# Altium footprint library ref-packages.PCBLIB: 1543 footprints (part 76 of 103) (continued)
## SQFP-S-10X10-120 [mm] (continued)
  rectangle: 4.95,-1.42 5.9,-1.28
  rectangle: 4.95,-1.12 5.9,-0.98
  rectangle: 4.95,-0.82 5.9,-0.68
  rectangle: 4.95,-0.52 5.9,-0.38
  rectangle: 4.95,-0.22 5.9,-0.08
  rectangle: 4.95,0.08 5.9,0.22
  rectangle: 4.95,0.38 5.9,0.52
  rectangle: 4.95,0.68 5.9,0.82
  rectangle: 4.95,0.98 5.9,1.12
  rectangle: 4.95,1.28 5.9,1.42
  rectangle: 4.95,1.58 5.9,1.72
  rectangle: 4.95,1.88 5.9,2.02
  rectangle: 4.95,2.18 5.9,2.32
  rectangle: 4.95,2.48 5.9,2.62
  rectangle: 4.95,2.78 5.9,2.92
  rectangle: 4.95,3.08 5.9,3.22
  rectangle: 4.95,3.38 5.9,3.52
  rectangle: 4.95,3.68 5.9,3.82
  rectangle: 4.95,3.98 5.9,4.12
  rectangle: 4.95,4.28 5.9,4.42
  rectangle: 4.28,4.95 4.42,5.9
  rectangle: 3.98,4.95 4.12,5.9
  rectangle: 3.68,4.95 3.82,5.9
  rectangle: 3.38,4.95 3.52,5.9
  rectangle: 3.08,4.95 3.22,5.9
  rectangle: 2.78,4.95 2.92,5.9
  rectangle: 2.48,4.95 2.62,5.9
  rectangle: 2.18,4.95 2.32,5.9
  rectangle: 1.88,4.95 2.02,5.9
  rectangle: 1.58,4.95 1.72,5.9
  rectangle: 1.28,4.95 1.42,5.9
  rectangle: 0.98,4.95 1.12,5.9
  rectangle: 0.68,4.95 0.82,5.9
  rectangle: 0.38,4.95 0.52,5.9
  rectangle: 0.08,4.95 0.22,5.9
  rectangle: -0.22,4.95 -0.08,5.9
  rectangle: -0.52,4.95 -0.38,5.9
  rectangle: -0.82,4.95 -0.68,5.9
  rectangle: -1.12,4.95 -0.98,5.9
  rectangle: -1.42,4.95 -1.28,5.9
  rectangle: -1.72,4.95 -1.58,5.9
  rectangle: -2.02,4.95 -1.88,5.9
  rectangle: -2.32,4.95 -2.18,5.9
  rectangle: -2.62,4.95 -2.48,5.9
  rectangle: -2.92,4.95 -2.78,5.9
  rectangle: -3.22,4.95 -3.08,5.9
  rectangle: -3.52,4.95 -3.38,5.9
  rectangle: -3.82,4.95 -3.68,5.9
  rectangle: -4.12,4.95 -3.98,5.9
  rectangle: -4.42,4.95 -4.28,5.9
  rectangle: -5.9,4.28 -4.95,4.42
  rectangle: -5.9,3.98 -4.95,4.12
  rectangle: -5.9,3.68 -4.95,3.82
  rectangle: -5.9,3.38 -4.95,3.52
  rectangle: -5.9,3.08 -4.95,3.22
  rectangle: -5.9,2.78 -4.95,2.92
  rectangle: -5.9,2.48 -4.95,2.62
  rectangle: -5.9,2.18 -4.95,2.32
  rectangle: -5.9,1.88 -4.95,2.02
  rectangle: -5.9,1.58 -4.95,1.72
  rectangle: -5.9,1.28 -4.95,1.42
  rectangle: -5.9,0.98 -4.95,1.12
  rectangle: -5.9,0.68 -4.95,0.82
  rectangle: -5.9,0.38 -4.95,0.52
  rectangle: -5.9,0.08 -4.95,0.22
  rectangle: -5.9,-0.22 -4.95,-0.08
  rectangle: -5.9,-0.52 -4.95,-0.38
  rectangle: -5.9,-0.82 -4.95,-0.68
  rectangle: -5.9,-1.12 -4.95,-0.98
  rectangle: -5.9,-1.42 -4.95,-1.28
  rectangle: -5.9,-1.72 -4.95,-1.58
  rectangle: -5.9,-2.02 -4.95,-1.88
  rectangle: -5.9,-2.32 -4.95,-2.18
  rectangle: -5.9,-2.62 -4.95,-2.48
  rectangle: -5.9,-2.92 -4.95,-2.78
  rectangle: -5.9,-3.22 -4.95,-3.08
  rectangle: -5.9,-3.52 -4.95,-3.38
  rectangle: -5.9,-3.82 -4.95,-3.68
  rectangle: -5.9,-4.12 -4.95,-3.98
  rectangle: -5.9,-4.42 -4.95,-4.28
  lines w0.203: -4.91,-4.91 4.91,-4.91 4.91,4.91 -4.91,4.91 -4.91,-4.91
Mechanical 27:
  lines w0.2: -6.9,-6.9 -6.9,6.9 6.9,6.9 6.9,-6.9 -6.9,-6.9

## SQFP-S-12X12-48 [mm]
pads (48):
  rect 0.5x1.8 smd: 1(-4.4,-7.1) 2(-3.6,-7.1) 3(-2.8,-7.1) 4(-2,-7.1) 5(-1.2,-7.1) 6(-0.4,-7.1) 7(0.4,-7.1) 8(1.2,-7.1) 9(2,-7.1) 10(2.8,-7.1) 11(3.6,-7.1) 12(4.4,-7.1) 25(4.4,7.1) 26(3.6,7.1) 27(2.8,7.1) 28(2,7.1) 29(1.2,7.1) 30(0.4,7.1) 31(-0.4,7.1) 32(-1.2,7.1) 33(-2,7.1) 34(-2.8,7.1) 35(-3.6,7.1) 36(-4.4,7.1)
  rect 1.8x0.5 smd: 13(7.1,-4.4) 14(7.1,-3.6) 15(7.1,-2.8) 16(7.1,-2) 17(7.1,-1.2) 18(7.1,-0.4) 19(7.1,0.4) 20(7.1,1.2) 21(7.1,2) 22(7.1,2.8) 23(7.1,3.6) 24(7.1,4.4) 37(-7.1,4.4) 38(-7.1,3.6) 39(-7.1,2.8) 40(-7.1,2) 41(-7.1,1.2) 42(-7.1,0.4) 43(-7.1,-0.4) 44(-7.1,-1.2) 45(-7.1,-2) 46(-7.1,-2.8) 47(-7.1,-3.6) 48(-7.1,-4.4)
Top Overlay:
  circle w0.254: c-4.5,-4.5 r0.75
  lines w0.203: -5.82,-5.81 5.81,-5.81 5.81,5.81 -5.82,5.81 -5.82,-5.81
Mechanical 16:
  rectangle: -4.62,-7.82 -4.18,-6.05
  rectangle: -3.82,-7.82 -3.38,-6.05
  rectangle: -3.02,-7.82 -2.58,-6.05
  rectangle: -2.22,-7.82 -1.78,-6.05
  rectangle: -1.42,-7.82 -0.98,-6.05
  rectangle: -0.62,-7.82 -0.18,-6.05
  rectangle: 0.18,-7.82 0.62,-6.05
  rectangle: 0.98,-7.82 1.42,-6.05
  rectangle: 1.78,-7.82 2.22,-6.05
  rectangle: 2.58,-7.82 3.02,-6.05
  rectangle: 3.38,-7.82 3.82,-6.05
  rectangle: 4.18,-7.82 4.62,-6.05
  rectangle: 6.05,-4.62 7.82,-4.18
  rectangle: 6.05,-3.82 7.82,-3.38
  rectangle: 6.05,-3.02 7.82,-2.58
  rectangle: 6.05,-2.22 7.82,-1.78
  rectangle: 6.05,-1.42 7.82,-0.98
  rectangle: 6.05,-0.62 7.82,-0.18
  rectangle: 6.05,0.18 7.82,0.62
  rectangle: 6.05,0.98 7.82,1.42
  rectangle: 6.05,1.78 7.82,2.22
  rectangle: 6.05,2.58 7.82,3.02
  rectangle: 6.05,3.38 7.82,3.82
  rectangle: 6.05,4.18 7.82,4.62
  rectangle: 4.18,6.05 4.62,7.82
  rectangle: 3.38,6.05 3.82,7.82
  rectangle: 2.58,6.05 3.02,7.82
  rectangle: 1.78,6.05 2.22,7.82
  rectangle: 0.98,6.05 1.42,7.82
  rectangle: 0.18,6.05 0.62,7.82
  rectangle: -0.62,6.05 -0.18,7.82
  rectangle: -1.42,6.05 -0.98,7.82
  rectangle: -2.22,6.05 -1.78,7.82
  rectangle: -3.02,6.05 -2.58,7.82
  rectangle: -3.82,6.05 -3.38,7.82
  rectangle: -4.62,6.05 -4.18,7.82
  rectangle: -7.82,4.18 -6.05,4.62
  rectangle: -7.82,3.38 -6.05,3.82
  rectangle: -7.82,2.58 -6.05,3.02
  rectangle: -7.82,1.78 -6.05,2.22
  rectangle: -7.82,0.98 -6.05,1.42
  rectangle: -7.82,0.18 -6.05,0.62
  rectangle: -7.82,-0.62 -6.05,-0.18
  rectangle: -7.82,-1.42 -6.05,-0.98
  rectangle: -7.82,-2.22 -6.05,-1.78
  rectangle: -7.82,-3.02 -6.05,-2.58
  rectangle: -7.82,-3.82 -6.05,-3.38
  rectangle: -7.82,-4.62 -6.05,-4.18
  lines w0.203: -6.01,-6.01 6.01,-6.01 6.01,6.01 -6.01,6.01 -6.01,-6.01
Mechanical 27:
  lines w0.2: -8.4,-8.4 -8.4,8.4 8.4,8.4 8.4,-8.4 -8.4,-8.4

## SQFP-S-12X12-64 [mil]
pads (64):
  rect 15.75x70.87 smd: 1(-191.93,-279.53) 2(-166.34,-279.53) 3(-140.75,-279.53) 4(-115.16,-279.53) 5(-89.57,-279.53) 6(-63.98,-279.53) 7(-38.39,-279.53) 8(-12.8,-279.53) 9(12.8,-279.53) 10(38.39,-279.53) 11(63.98,-279.53) 12(89.57,-279.53) 13(115.16,-279.53) 14(140.75,-279.53) 15(166.34,-279.53) 16(191.93,-279.53) 33(191.93,279.53) 34(166.34,279.53) 35(140.75,279.53) 36(115.16,279.53) 37(89.57,279.53) 38(63.98,279.53) 39(38.39,279.53) 40(12.8,279.53) 41(-12.8,279.53) 42(-38.39,279.53) 43(-63.98,279.53) 44(-89.57,279.53) 45(-115.16,279.53) 46(-140.75,279.53) 47(-166.34,279.53) 48(-191.93,279.53)
  rect 70.87x15.75 smd: 17(279.53,-191.93) 18(279.53,-166.34) 19(279.53,-140.75) 20(279.53,-115.16) 21(279.53,-89.57) 22(279.53,-63.98) 23(279.53,-38.39) 24(279.53,-12.8) 25(279.53,12.8) 26(279.53,38.39) 27(279.53,63.98) 28(279.53,89.57) 29(279.53,115.16) 30(279.53,140.75) 31(279.53,166.34) 32(279.53,191.93) 49(-279.53,191.93) 50(-279.53,166.34) 51(-279.53,140.75) 52(-279.53,115.16) 53(-279.53,89.57) 54(-279.53,63.98) 55(-279.53,38.39) 56(-279.53,12.8) 57(-279.53,-12.8) 58(-279.53,-38.39) 59(-279.53,-63.98) 60(-279.53,-89.57) 61(-279.53,-115.16) 62(-279.53,-140.75) 63(-279.53,-166.34) 64(-279.53,-191.93)
Top Overlay:
  circle w10: c-187.01,-187.01 r29.53
  lines w8: -229.13,-228.74 228.74,-228.74 228.74,228.74 -229.13,228.74 -229.13,-228.74
Mechanical 16:
  rectangle: -199.41,-307.87 -184.45,-238.19
  rectangle: -173.82,-307.87 -158.86,-238.19
  rectangle: -148.23,-307.87 -133.27,-238.19
  rectangle: -122.64,-307.87 -107.68,-238.19
  rectangle: -97.05,-307.87 -82.09,-238.19
  rectangle: -71.46,-307.87 -56.5,-238.19
  rectangle: -45.87,-307.87 -30.91,-238.19
  rectangle: -20.28,-307.87 -5.31,-238.19
  rectangle: 5.31,-307.87 20.28,-238.19
  rectangle: 30.91,-307.87 45.87,-238.19
  rectangle: 56.5,-307.87 71.46,-238.19
  rectangle: 82.09,-307.87 97.05,-238.19
  rectangle: 107.68,-307.87 122.64,-238.19
  rectangle: 133.27,-307.87 148.23,-238.19
  rectangle: 158.86,-307.87 173.82,-238.19
  rectangle: 184.45,-307.87 199.41,-238.19
  rectangle: 238.19,-199.41 307.87,-184.45
  rectangle: 238.19,-173.82 307.87,-158.86
  rectangle: 238.19,-148.23 307.87,-133.27
  rectangle: 238.19,-122.64 307.87,-107.68
  rectangle: 238.19,-97.05 307.87,-82.09
  rectangle: 238.19,-71.46 307.87,-56.5
  rectangle: 238.19,-45.87 307.87,-30.91
  rectangle: 238.19,-20.28 307.87,-5.31
  rectangle: 238.19,5.31 307.87,20.28
  rectangle: 238.19,30.91 307.87,45.87
  rectangle: 238.19,56.5 307.87,71.46
  rectangle: 238.19,82.09 307.87,97.05
  rectangle: 238.19,107.68 307.87,122.64
  rectangle: 238.19,133.27 307.87,148.23
  rectangle: 238.19,158.86 307.87,173.82
  rectangle: 238.19,184.45 307.87,199.41
  rectangle: 184.45,238.19 199.41,307.87
  rectangle: 158.86,238.19 173.82,307.87
  rectangle: 133.27,238.19 148.23,307.87
  rectangle: 107.68,238.19 122.64,307.87
  rectangle: 82.09,238.19 97.05,307.87
  rectangle: 56.5,238.19 71.46,307.87
  rectangle: 30.91,238.19 45.87,307.87
  rectangle: 5.31,238.19 20.28,307.87
  rectangle: -20.28,238.19 -5.31,307.87
  rectangle: -45.87,238.19 -30.91,307.87
  rectangle: -71.46,238.19 -56.5,307.87
  rectangle: -97.05,238.19 -82.09,307.87
  rectangle: -122.64,238.19 -107.68,307.87
  rectangle: -148.23,238.19 -133.27,307.87
  rectangle: -173.82,238.19 -158.86,307.87
  rectangle: -199.41,238.19 -184.45,307.87
  rectangle: -307.87,184.45 -238.19,199.41
  rectangle: -307.87,158.86 -238.19,173.82
  rectangle: -307.87,133.27 -238.19,148.23
  rectangle: -307.87,107.68 -238.19,122.64
  rectangle: -307.87,82.09 -238.19,97.05
  rectangle: -307.87,56.5 -238.19,71.46
  rectangle: -307.87,30.91 -238.19,45.87
  rectangle: -307.87,5.31 -238.19,20.28
  rectangle: -307.87,-20.28 -238.19,-5.31
  rectangle: -307.87,-45.87 -238.19,-30.91
  rectangle: -307.87,-71.46 -238.19,-56.5
  rectangle: -307.87,-97.05 -238.19,-82.09
  rectangle: -307.87,-122.64 -238.19,-107.68
  rectangle: -307.87,-148.23 -238.19,-133.27
  rectangle: -307.87,-173.82 -238.19,-158.86
  rectangle: -307.87,-199.41 -238.19,-184.45
  lines w8: -236.61,-236.61 236.61,-236.61 236.61,236.61 -236.61,236.61 -236.61,-236.61
Mechanical 27:
  lines w7.87: -330.71,-330.71 -330.71,330.71 330.71,330.71 330.71,-330.71 -330.71,-330.71

## SQFP-S-12X12-80 [mil]
pads (80):
  rect 11.81x62.99 smd: 1(-187.01,-259.84) 2(-167.32,-259.84) 3(-147.64,-259.84) 4(-127.95,-259.84) 5(-108.27,-259.84) 6(-88.58,-259.84) 7(-68.9,-259.84) 8(-49.21,-259.84) 9(-29.53,-259.84) 10(-9.84,-259.84) 11(9.84,-259.84) 12(29.53,-259.84) 13(49.21,-259.84) 14(68.9,-259.84) 15(88.58,-259.84) 16(108.27,-259.84) 17(127.95,-259.84) 18(147.64,-259.84) 19(167.32,-259.84) 20(187.01,-259.84) 41(187.01,259.84) 42(167.32,259.84) 43(147.64,259.84) 44(127.95,259.84) 45(108.27,259.84) 46(88.58,259.84) 47(68.9,259.84) 48(49.21,259.84) 49(29.53,259.84) 50(9.84,259.84) 51(-9.84,259.84) 52(-29.53,259.84) 53(-49.21,259.84) 54(-68.9,259.84) 55(-88.58,259.84) 56(-108.27,259.84) 57(-127.95,259.84) 58(-147.64,259.84) 59(-167.32,259.84) 60(-187.01,259.84)
  rect 62.99x11.81 smd: 21(259.84,-187.01) 22(259.84,-167.32) 23(259.84,-147.64) 24(259.84,-127.95) 25(259.84,-108.27) 26(259.84,-88.58) 27(259.84,-68.9) 28(259.84,-49.21) 29(259.84,-29.53) 30(259.84,-9.84) 31(259.84,9.84) 32(259.84,29.53) 33(259.84,49.21) 34(259.84,68.9) 35(259.84,88.58) 36(259.84,108.27) 37(259.84,127.95) 38(259.84,147.64) 39(259.84,167.32) 40(259.84,187.01) 61(-259.84,187.01) 62(-259.84,167.32) 63(-259.84,147.64) 64(-259.84,127.95) 65(-259.84,108.27) 66(-259.84,88.58) 67(-259.84,68.9) 68(-259.84,49.21) 69(-259.84,29.53) 70(-259.84,9.84) 71(-259.84,-9.84) 72(-259.84,-29.53) 73(-259.84,-49.21) 74(-259.84,-68.9) 75(-259.84,-88.58) 76(-259.84,-108.27) 77(-259.84,-127.95) 78(-259.84,-147.64) 79(-259.84,-167.32) 80(-259.84,-187.01)
Top Overlay:
  circle w10: c-177.17,-177.17 r29.53
  lines w8: -225.2,-224.8 224.8,-224.8 224.8,224.8 -225.2,224.8 -225.2,-224.8
Mechanical 16:
  rectangle: -192.91,-271.65 -181.1,-234.25
  rectangle: -173.23,-271.65 -161.42,-234.25
  rectangle: -153.54,-271.65 -141.73,-234.25
  rectangle: -133.86,-271.65 -122.05,-234.25
  rectangle: -114.17,-271.65 -102.36,-234.25
  rectangle: -94.49,-271.65 -82.68,-234.25
  rectangle: -74.8,-271.65 -62.99,-234.25
  rectangle: -55.12,-271.65 -43.31,-234.25
  rectangle: -35.43,-271.65 -23.62,-234.25
  rectangle: -15.75,-271.65 -3.94,-234.25
  rectangle: 3.94,-271.65 15.75,-234.25
  rectangle: 23.62,-271.65 35.43,-234.25
  rectangle: 43.31,-271.65 55.12,-234.25
  rectangle: 62.99,-271.65 74.8,-234.25
  rectangle: 82.68,-271.65 94.49,-234.25
  rectangle: 102.36,-271.65 114.17,-234.25
  rectangle: 122.05,-271.65 133.86,-234.25
  rectangle: 141.73,-271.65 153.54,-234.25
  rectangle: 161.42,-271.65 173.23,-234.25
  rectangle: 181.1,-271.65 192.91,-234.25
  rectangle: 234.25,-192.91 271.65,-181.1
  rectangle: 234.25,-173.23 271.65,-161.42
  rectangle: 234.25,-153.54 271.65,-141.73
  rectangle: 234.25,-133.86 271.65,-122.05
  rectangle: 234.25,-114.17 271.65,-102.36
  rectangle: 234.25,-94.49 271.65,-82.68
  rectangle: 234.25,-74.8 271.65,-62.99
  rectangle: 234.25,-55.12 271.65,-43.31
  rectangle: 234.25,-35.43 271.65,-23.62
  rectangle: 234.25,-15.75 271.65,-3.94
  rectangle: 234.25,3.94 271.65,15.75
  rectangle: 234.25,23.62 271.65,35.43
  rectangle: 234.25,43.31 271.65,55.12
  rectangle: 234.25,62.99 271.65,74.8
  rectangle: 234.25,82.68 271.65,94.49
  rectangle: 234.25,102.36 271.65,114.17
  rectangle: 234.25,122.05 271.65,133.86
  rectangle: 234.25,141.73 271.65,153.54
  rectangle: 234.25,161.42 271.65,173.23
  rectangle: 234.25,181.1 271.65,192.91
  rectangle: 181.1,234.25 192.91,271.65
  rectangle: 161.42,234.25 173.23,271.65
  rectangle: 141.73,234.25 153.54,271.65
  rectangle: 122.05,234.25 133.86,271.65
  rectangle: 102.36,234.25 114.17,271.65
  rectangle: 82.68,234.25 94.49,271.65
  rectangle: 62.99,234.25 74.8,271.65
  rectangle: 43.31,234.25 55.12,271.65
  rectangle: 23.62,234.25 35.43,271.65
  rectangle: 3.94,234.25 15.75,271.65
  rectangle: -15.75,234.25 -3.94,271.65
  rectangle: -35.43,234.25 -23.62,271.65
  rectangle: -55.12,234.25 -43.31,271.65
  rectangle: -74.8,234.25 -62.99,271.65
  rectangle: -94.49,234.25 -82.68,271.65
  rectangle: -114.17,234.25 -102.36,271.65
  rectangle: -133.86,234.25 -122.05,271.65
  rectangle: -153.54,234.25 -141.73,271.65
  rectangle: -173.23,234.25 -161.42,271.65
  rectangle: -192.91,234.25 -181.1,271.65
  rectangle: -271.65,181.1 -234.25,192.91
  rectangle: -271.65,161.42 -234.25,173.23
  rectangle: -271.65,141.73 -234.25,153.54
  rectangle: -271.65,122.05 -234.25,133.86
  rectangle: -271.65,102.36 -234.25,114.17
  rectangle: -271.65,82.68 -234.25,94.49
  rectangle: -271.65,62.99 -234.25,74.8
  rectangle: -271.65,43.31 -234.25,55.12
  rectangle: -271.65,23.62 -234.25,35.43
  rectangle: -271.65,3.94 -234.25,15.75
  rectangle: -271.65,-15.75 -234.25,-3.94
  rectangle: -271.65,-35.43 -234.25,-23.62
  rectangle: -271.65,-55.12 -234.25,-43.31
  rectangle: -271.65,-74.8 -234.25,-62.99
  rectangle: -271.65,-94.49 -234.25,-82.68
  rectangle: -271.65,-114.17 -234.25,-102.36
  rectangle: -271.65,-133.86 -234.25,-122.05
  rectangle: -271.65,-153.54 -234.25,-141.73
  rectangle: -271.65,-173.23 -234.25,-161.42
  rectangle: -271.65,-192.91 -234.25,-181.1
  lines w8: -232.68,-232.68 232.68,-232.68 232.68,232.68 -232.68,232.68 -232.68,-232.68
Mechanical 27:
  lines w7.87: -311.02,-311.02 -311.02,311.02 311.02,311.02 311.02,-311.02 -311.02,-311.02

## SQFP-S-12X12-88 [mil]
pads (88):
  rect 11.81x62.99 smd: 1(-206.69,-259.84) 2(-187.01,-259.84) 3(-167.32,-259.84) 4(-147.64,-259.84) 5(-127.95,-259.84) 6(-108.27,-259.84) 7(-88.58,-259.84) 8(-68.9,-259.84) 9(-49.21,-259.84) 10(-29.53,-259.84) 11(-9.84,-259.84) 12(9.84,-259.84) 13(29.53,-259.84) 14(49.21,-259.84) 15(68.9,-259.84) 16(88.58,-259.84) 17(108.27,-259.84) 18(127.95,-259.84) 19(147.64,-259.84) 20(167.32,-259.84) 21(187.01,-259.84) 22(206.69,-259.84) 45(206.69,259.84) 46(187.01,259.84) 47(167.32,259.84) 48(147.64,259.84) 49(127.95,259.84) 50(108.27,259.84) 51(88.58,259.84) 52(68.9,259.84) 53(49.21,259.84) 54(29.53,259.84) 55(9.84,259.84) 56(-9.84,259.84) 57(-29.53,259.84) 58(-49.21,259.84) 59(-68.9,259.84) 60(-88.58,259.84) 61(-108.27,259.84) 62(-127.95,259.84) 63(-147.64,259.84) 64(-167.32,259.84) 65(-187.01,259.84) 66(-206.69,259.84)
  rect 62.99x11.81 smd: 23(259.84,-206.69) 24(259.84,-187.01) 25(259.84,-167.32) 26(259.84,-147.64) 27(259.84,-127.95) 28(259.84,-108.27) 29(259.84,-88.58) 30(259.84,-68.9) 31(259.84,-49.21) 32(259.84,-29.53) 33(259.84,-9.84) 34(259.84,9.84) 35(259.84,29.53) 36(259.84,49.21) 37(259.84,68.9) 38(259.84,88.58) 39(259.84,108.27) 40(259.84,127.95) 41(259.84,147.64) 42(259.84,167.32) 43(259.84,187.01) 44(259.84,206.69) 67(-259.84,206.69) 68(-259.84,187.01) 69(-259.84,167.32) 70(-259.84,147.64) 71(-259.84,127.95) 72(-259.84,108.27) 73(-259.84,88.58) 74(-259.84,68.9) 75(-259.84,49.21) 76(-259.84,29.53) 77(-259.84,9.84) 78(-259.84,-9.84) 79(-259.84,-29.53) 80(-259.84,-49.21) 81(-259.84,-68.9) 82(-259.84,-88.58) 83(-259.84,-108.27) 84(-259.84,-127.95) 85(-259.84,-147.64) 86(-259.84,-167.32) 87(-259.84,-187.01) 88(-259.84,-206.69)
Top Overlay:
  circle w10: c-177.17,-177.17 r29.53
  lines w8: -225.2,-224.8 224.8,-224.8 224.8,224.8 -225.2,224.8 -225.2,-224.8
Mechanical 16:
  rectangle: -212.6,-271.65 -200.79,-234.25
  rectangle: -192.91,-271.65 -181.1,-234.25
  rectangle: -173.23,-271.65 -161.42,-234.25
  rectangle: -153.54,-271.65 -141.73,-234.25
  rectangle: -133.86,-271.65 -122.05,-234.25
  rectangle: -114.17,-271.65 -102.36,-234.25
  rectangle: -94.49,-271.65 -82.68,-234.25
  rectangle: -74.8,-271.65 -62.99,-234.25
  rectangle: -55.12,-271.65 -43.31,-234.25
  rectangle: -35.43,-271.65 -23.62,-234.25
  rectangle: -15.75,-271.65 -3.94,-234.25
  rectangle: 3.94,-271.65 15.75,-234.25
  rectangle: 23.62,-271.65 35.43,-234.25
  rectangle: 43.31,-271.65 55.12,-234.25
  rectangle: 62.99,-271.65 74.8,-234.25
  rectangle: 82.68,-271.65 94.49,-234.25
  rectangle: 102.36,-271.65 114.17,-234.25
  rectangle: 122.05,-271.65 133.86,-234.25
  rectangle: 141.73,-271.65 153.54,-234.25
  rectangle: 161.42,-271.65 173.23,-234.25
  rectangle: 181.1,-271.65 192.91,-234.25
  rectangle: 200.79,-271.65 212.6,-234.25
  rectangle: 234.25,-212.6 271.65,-200.79
  rectangle: 234.25,-192.91 271.65,-181.1
  rectangle: 234.25,-173.23 271.65,-161.42
  rectangle: 234.25,-153.54 271.65,-141.73
  rectangle: 234.25,-133.86 271.65,-122.05
  rectangle: 234.25,-114.17 271.65,-102.36
  rectangle: 234.25,-94.49 271.65,-82.68
  rectangle: 234.25,-74.8 271.65,-62.99
  rectangle: 234.25,-55.12 271.65,-43.31
  rectangle: 234.25,-35.43 271.65,-23.62
  rectangle: 234.25,-15.75 271.65,-3.94
  rectangle: 234.25,3.94 271.65,15.75
  rectangle: 234.25,23.62 271.65,35.43
  rectangle: 234.25,43.31 271.65,55.12
  rectangle: 234.25,62.99 271.65,74.8
  rectangle: 234.25,82.68 271.65,94.49
  rectangle: 234.25,102.36 271.65,114.17
  rectangle: 234.25,122.05 271.65,133.86
  rectangle: 234.25,141.73 271.65,153.54
  rectangle: 234.25,161.42 271.65,173.23
  rectangle: 234.25,181.1 271.65,192.91
  rectangle: 234.25,200.79 271.65,212.6
  rectangle: 200.79,234.25 212.6,271.65
  rectangle: 181.1,234.25 192.91,271.65
  rectangle: 161.42,234.25 173.23,271.65
  rectangle: 141.73,234.25 153.54,271.65
  rectangle: 122.05,234.25 133.86,271.65
  rectangle: 102.36,234.25 114.17,271.65
  rectangle: 82.68,234.25 94.49,271.65
  rectangle: 62.99,234.25 74.8,271.65
  rectangle: 43.31,234.25 55.12,271.65
  rectangle: 23.62,234.25 35.43,271.65
  rectangle: 3.94,234.25 15.75,271.65
  rectangle: -15.75,234.25 -3.94,271.65
  rectangle: -35.43,234.25 -23.62,271.65
  rectangle: -55.12,234.25 -43.31,271.65
  rectangle: -74.8,234.25 -62.99,271.65
  rectangle: -94.49,234.25 -82.68,271.65
  rectangle: -114.17,234.25 -102.36,271.65
  rectangle: -133.86,234.25 -122.05,271.65
  rectangle: -153.54,234.25 -141.73,271.65
  rectangle: -173.23,234.25 -161.42,271.65
  rectangle: -192.91,234.25 -181.1,271.65
  rectangle: -212.6,234.25 -200.79,271.65
  rectangle: -271.65,200.79 -234.25,212.6
  rectangle: -271.65,181.1 -234.25,192.91
  rectangle: -271.65,161.42 -234.25,173.23
  rectangle: -271.65,141.73 -234.25,153.54
  rectangle: -271.65,122.05 -234.25,133.86
  rectangle: -271.65,102.36 -234.25,114.17
  rectangle: -271.65,82.68 -234.25,94.49
  rectangle: -271.65,62.99 -234.25,74.8
  rectangle: -271.65,43.31 -234.25,55.12
  rectangle: -271.65,23.62 -234.25,35.43
  rectangle: -271.65,3.94 -234.25,15.75
  rectangle: -271.65,-15.75 -234.25,-3.94
  rectangle: -271.65,-35.43 -234.25,-23.62
  rectangle: -271.65,-55.12 -234.25,-43.31
  rectangle: -271.65,-74.8 -234.25,-62.99
  rectangle: -271.65,-94.49 -234.25,-82.68
  rectangle: -271.65,-114.17 -234.25,-102.36
  rectangle: -271.65,-133.86 -234.25,-122.05
  rectangle: -271.65,-153.54 -234.25,-141.73
  rectangle: -271.65,-173.23 -234.25,-161.42
  rectangle: -271.65,-192.91 -234.25,-181.1
  rectangle: -271.65,-212.6 -234.25,-200.79
  lines w8: -232.68,-232.68 232.68,-232.68 232.68,232.68 -232.68,232.68 -232.68,-232.68
Mechanical 27:
  lines w7.87: -311.02,-311.02 -311.02,311.02 311.02,311.02 311.02,-311.02 -311.02,-311.02

## SQFP-S-12X12-100 [mm]
pads (100):
  rect 0.25x1.6 smd: 1(-4.8,-6.6) 2(-4.4,-6.6) 3(-4,-6.6) 4(-3.6,-6.6) 5(-3.2,-6.6) 6(-2.8,-6.6) 7(-2.4,-6.6) 8(-2,-6.6) 9(-1.6,-6.6) 10(-1.2,-6.6) 11(-0.8,-6.6) 12(-0.4,-6.6) 13(0,-6.6) 14(0.4,-6.6) 15(0.8,-6.6) 16(1.2,-6.6) 17(1.6,-6.6) 18(2,-6.6) 19(2.4,-6.6) 20(2.8,-6.6) 21(3.2,-6.6) 22(3.6,-6.6) 23(4,-6.6) 24(4.4,-6.6) 25(4.8,-6.6) 51(4.8,6.6) 52(4.4,6.6) 53(4,6.6) 54(3.6,6.6) 55(3.2,6.6) 56(2.8,6.6) 57(2.4,6.6) 58(2,6.6) 59(1.6,6.6) 60(1.2,6.6) 61(0.8,6.6) 62(0.4,6.6) 63(0,6.6) 64(-0.4,6.6) 65(-0.8,6.6) 66(-1.2,6.6) 67(-1.6,6.6) 68(-2,6.6) 69(-2.4,6.6) 70(-2.8,6.6) 71(-3.2,6.6) 72(-3.6,6.6) 73(-4,6.6) 74(-4.4,6.6) 75(-4.8,6.6)
  rect 1.6x0.25 smd: 26(6.6,-4.8) 27(6.6,-4.4) 28(6.6,-4) 29(6.6,-3.6) 30(6.6,-3.2) 31(6.6,-2.8) 32(6.6,-2.4) 33(6.6,-2) 34(6.6,-1.6) 35(6.6,-1.2) 36(6.6,-0.8) 37(6.6,-0.4) 38(6.6,0) 39(6.6,0.4) 40(6.6,0.8) 41(6.6,1.2) 42(6.6,1.6) 43(6.6,2) 44(6.6,2.4) 45(6.6,2.8) 46(6.6,3.2) 47(6.6,3.6) 48(6.6,4) 49(6.6,4.4) 50(6.6,4.8) 76(-6.6,4.8) 77(-6.6,4.4) 78(-6.6,4) 79(-6.6,3.6) 80(-6.6,3.2) 81(-6.6,2.8) 82(-6.6,2.4) 83(-6.6,2) 84(-6.6,1.6) 85(-6.6,1.2) 86(-6.6,0.8) 87(-6.6,0.4) 88(-6.6,0) 89(-6.6,-0.4) 90(-6.6,-0.8) 91(-6.6,-1.2) 92(-6.6,-1.6) 93(-6.6,-2) 94(-6.6,-2.4) 95(-6.6,-2.8) 96(-6.6,-3.2) 97(-6.6,-3.6) 98(-6.6,-4) 99(-6.6,-4.4) 100(-6.6,-4.8)
Top Overlay:
  circle w0.254: c-4.5,-4.5 r0.75
  lines w0.203: -5.72,-5.71 5.71,-5.71 5.71,5.71 -5.72,5.71 -5.72,-5.71
Mechanical 16:
  rectangle: -4.91,-6.9 -4.69,-5.95
  rectangle: -4.51,-6.9 -4.29,-5.95
  rectangle: -4.11,-6.9 -3.89,-5.95
  rectangle: -3.71,-6.9 -3.49,-5.95
  rectangle: -3.31,-6.9 -3.09,-5.95
  rectangle: -2.91,-6.9 -2.69,-5.95
  rectangle: -2.51,-6.9 -2.29,-5.95
  rectangle: -2.11,-6.9 -1.89,-5.95
  rectangle: -1.71,-6.9 -1.49,-5.95
  rectangle: -1.31,-6.9 -1.09,-5.95
  rectangle: -0.91,-6.9 -0.69,-5.95
  rectangle: -0.51,-6.9 -0.29,-5.95
  rectangle: -0.11,-6.9 0.11,-5.95
  rectangle: 0.29,-6.9 0.51,-5.95
  rectangle: 0.69,-6.9 0.91,-5.95
  rectangle: 1.09,-6.9 1.31,-5.95
  rectangle: 1.49,-6.9 1.71,-5.95
  rectangle: 1.89,-6.9 2.11,-5.95
  rectangle: 2.29,-6.9 2.51,-5.95
  rectangle: 2.69,-6.9 2.91,-5.95
  rectangle: 3.09,-6.9 3.31,-5.95
  rectangle: 3.49,-6.9 3.71,-5.95
  rectangle: 3.89,-6.9 4.11,-5.95
  rectangle: 4.29,-6.9 4.51,-5.95
  rectangle: 4.69,-6.9 4.91,-5.95
  rectangle: 5.95,-4.91 6.9,-4.69
  rectangle: 5.95,-4.51 6.9,-4.29
  rectangle: 5.95,-4.11 6.9,-3.89
  rectangle: 5.95,-3.71 6.9,-3.49
  rectangle: 5.95,-3.31 6.9,-3.09
  rectangle: 5.95,-2.91 6.9,-2.69
  rectangle: 5.95,-2.51 6.9,-2.29
  rectangle: 5.95,-2.11 6.9,-1.89
  rectangle: 5.95,-1.71 6.9,-1.49
  rectangle: 5.95,-1.31 6.9,-1.09
  rectangle: 5.95,-0.91 6.9,-0.69
  rectangle: 5.95,-0.51 6.9,-0.29
  rectangle: 5.95,-0.11 6.9,0.11
  rectangle: 5.95,0.29 6.9,0.51
  rectangle: 5.95,0.69 6.9,0.91
  rectangle: 5.95,1.09 6.9,1.31
  rectangle: 5.95,1.49 6.9,1.71
  rectangle: 5.95,1.89 6.9,2.11
  rectangle: 5.95,2.29 6.9,2.51
  rectangle: 5.95,2.69 6.9,2.91
  rectangle: 5.95,3.09 6.9,3.31
  rectangle: 5.95,3.49 6.9,3.71
  rectangle: 5.95,3.89 6.9,4.11
  rectangle: 5.95,4.29 6.9,4.51
  rectangle: 5.95,4.69 6.9,4.91
  rectangle: 4.69,5.95 4.91,6.9
  rectangle: 4.29,5.95 4.51,6.9
  rectangle: 3.89,5.95 4.11,6.9
  rectangle: 3.49,5.95 3.71,6.9
  rectangle: 3.09,5.95 3.31,6.9
  rectangle: 2.69,5.95 2.91,6.9
  rectangle: 2.29,5.95 2.51,6.9
  rectangle: 1.89,5.95 2.11,6.9
  rectangle: 1.49,5.95 1.71,6.9
  rectangle: 1.09,5.95 1.31,6.9
  rectangle: 0.69,5.95 0.91,6.9
  rectangle: 0.29,5.95 0.51,6.9
  rectangle: -0.11,5.95 0.11,6.9
  rectangle: -0.51,5.95 -0.29,6.9
  rectangle: -0.91,5.95 -0.69,6.9
  rectangle: -1.31,5.95 -1.09,6.9
  rectangle: -1.71,5.95 -1.49,6.9
  rectangle: -2.11,5.95 -1.89,6.9
  rectangle: -2.51,5.95 -2.29,6.9
  rectangle: -2.91,5.95 -2.69,6.9
  rectangle: -3.31,5.95 -3.09,6.9
  rectangle: -3.71,5.95 -3.49,6.9
  rectangle: -4.11,5.95 -3.89,6.9
  rectangle: -4.51,5.95 -4.29,6.9
  rectangle: -4.91,5.95 -4.69,6.9
  rectangle: -6.9,4.69 -5.95,4.91
  rectangle: -6.9,4.29 -5.95,4.51
  rectangle: -6.9,3.89 -5.95,4.11
  rectangle: -6.9,3.49 -5.95,3.71
  rectangle: -6.9,3.09 -5.95,3.31
  rectangle: -6.9,2.69 -5.95,2.91
  rectangle: -6.9,2.29 -5.95,2.51
  rectangle: -6.9,1.89 -5.95,2.11
  rectangle: -6.9,1.49 -5.95,1.71
  rectangle: -6.9,1.09 -5.95,1.31
  rectangle: -6.9,0.69 -5.95,0.91
  rectangle: -6.9,0.29 -5.95,0.51
  rectangle: -6.9,-0.11 -5.95,0.11
  rectangle: -6.9,-0.51 -5.95,-0.29
  rectangle: -6.9,-0.91 -5.95,-0.69
  rectangle: -6.9,-1.31 -5.95,-1.09
  rectangle: -6.9,-1.71 -5.95,-1.49
  rectangle: -6.9,-2.11 -5.95,-1.89
  rectangle: -6.9,-2.51 -5.95,-2.29
  rectangle: -6.9,-2.91 -5.95,-2.69
  rectangle: -6.9,-3.31 -5.95,-3.09
  rectangle: -6.9,-3.71 -5.95,-3.49
  rectangle: -6.9,-4.11 -5.95,-3.89
  rectangle: -6.9,-4.51 -5.95,-4.29
  rectangle: -6.9,-4.91 -5.95,-4.69
  lines w0.203: -5.91,-5.91 5.91,-5.91 5.91,5.91 -5.91,5.91 -5.91,-5.91
Mechanical 27:
  lines w0.2: -7.9,-7.9 -7.9,7.9 7.9,7.9 7.9,-7.9 -7.9,-7.9